# Altium footprint library SINA.PcbLib: 103 footprints (part 4 of 7)
Each footprint in its own frame and in the unit in brackets; x right, y up, seen from the top. Pads: shape width x height; smd on the part's side, far side on the other; paste and mask are expansions set on the pad; w line width, h text height; cw(c..) or ccw(c..) is an arc to the next point about the centre after c.
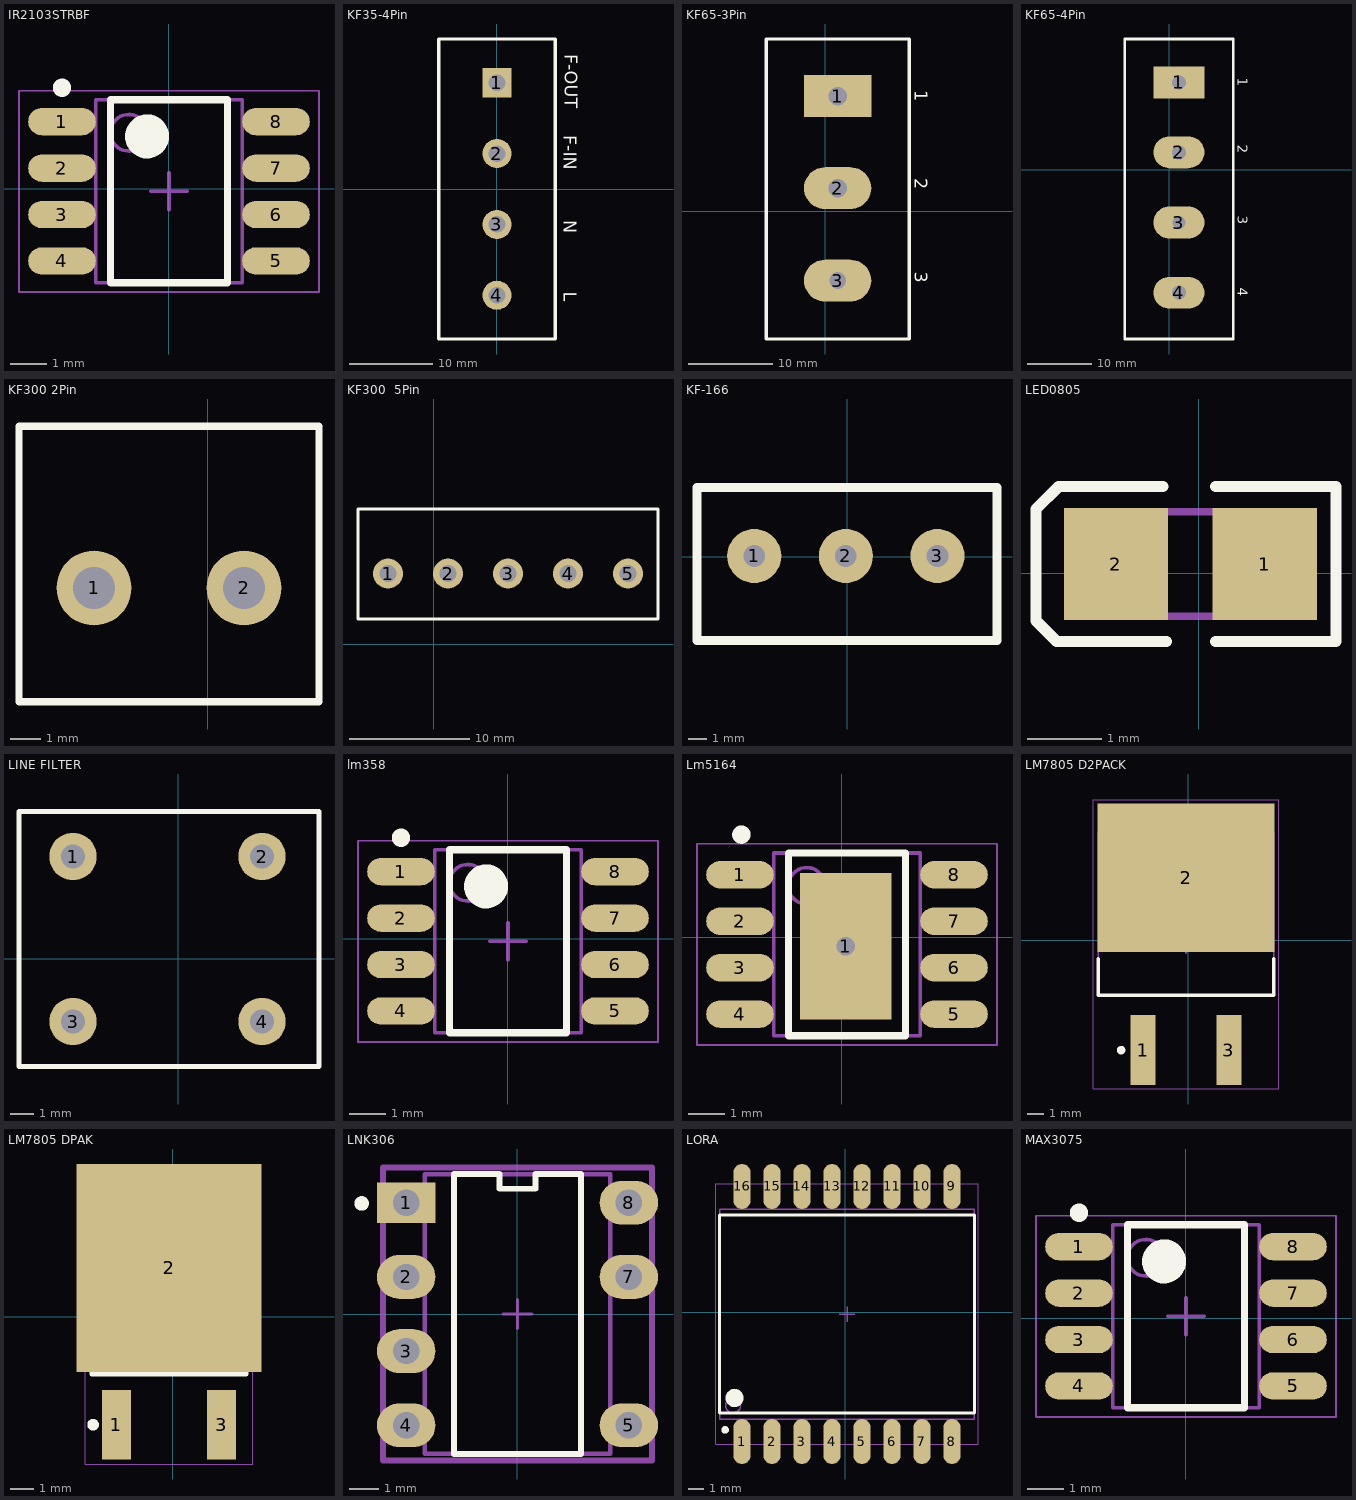
[diagram p3: the footprints below, top view; thin cyan lines are the x and y axes]

## IR2103STRBF [mm]
pads (8):
  oval 1.85x0.75 smd: 1(-2.915,1.831) 2(-2.915,0.561) 3(-2.915,-0.709) 4(-2.915,-1.979) 5(2.935,-1.979) 6(2.935,-0.709) 7(2.935,0.561) 8(2.935,1.831)
Top Overlay:
  circle w0.6: c-0.59,1.426 r0.3
  circle w0.25: c-2.915,2.756 r0.125
  lines w0.2: -1.59,-2.574 1.61,-2.574 1.61,2.426 -1.59,2.426 -1.59,-2.574
Mechanical 13:
  circle w0.1: c-1.09,1.526 r0.5
  lines w0.1: -1.99,-2.574 2.01,-2.574 2.01,2.426 -1.99,2.426 -1.99,-2.574
Mechanical 15:
  lines w0.05: -4.09,-2.824 4.11,-2.824 4.11,2.676 -4.09,2.676 -4.09,-2.824
  lines w0.1: -0.49,-0.074 0.51,-0.074 ; 0.01,-0.574 0.01,0.426
3D body "LM358.step": height 1.35, standoff 0, extent -3.24,-2.574 3.26,2.426

## KF35-4Pin [mm]
pads (4):
  rect 3.5x3.5 hole 2: 1(0,12.75)
  round 3.5 hole 2: 2(0,4.25) 3(0,-4.25) 4(0,-12.75)
Top Overlay:
  lines w0.406: -7,-18 -7,18 7,18 7,-18 -7,-18
  text "F-IN" at 8,6.475 h1.52
  text "F-OUT" at 8.125,16.175 h1.52
  text "N" at 8,-3.725 h1.52
  text "L" at 8,-12.35 h1.52
Mechanical 13:
  lines w0.1: -7,-18 -7,18 7,18 7,-18 -7,-18
3D body "LW3B  4P Terminal v1.step": height 14.65, standoff -3.8, extent -7.625,-17 7.625,17

## KF65-3Pin [mm]
pads (3):
  rect 8x5 hole 2.2: 1(1.5,13.7)
  oval 8x5 hole 2.2: 2(1.5,2.75)
  oval 8x5 hole 2: 3(1.5,-8.25)
Top Overlay:
  lines w0.406: -7,-15.2 10,-15.2 10,20.5 -7,20.5 -7,-15.2
  text "3" at 10.7,-7.2 h1.52
  text "1" at 10.7,14.4 h1.52
  text "2" at 10.7,3.9 h1.52
Mechanical 13:
  lines w0.1: -7,-15.2 10,-15.2 10,20.5 -7,20.5 -7,-15.2
3D body "anver_com-21700252-DEFAULT.STEP": height 15, standoff 6, extent -2.8,-13.1 5.2,-5.1
3D body "anver_com-21700252-DEFAULT.STEP": height 15, standoff 6, extent -2.9,-1.25 5.1,6.75
3D body "anver_com-21700252-DEFAULT.STEP": height 15, standoff 6, extent -2.6,10 5.4,18
3D body: height 5, standoff -4.5, extent 1.1,12.7 2,14.3
3D body: height 5, standoff -4.5, extent 1.1,1.9 2,3.5
3D body: height 5, standoff -4.5, extent 1.1,-9.1 2,-7.5
3D body: height 12, standoff 11, extent -3.7,-13.8 6.3,-3.8
3D body: height 12, standoff 11, extent -3.7,-2.3 6.3,7.7
3D body: height 12, standoff 11, extent -3.7,9.1 6.3,19.1
3D body: height 0.25, standoff 0, extent 20.3,10.6 20.3,10.6
3D body: height 10.5, standoff 1.8, extent -6.4,-15.1 9.4,19
3D body: height 0.25, standoff 0, extent -6.6,19 -6.6,19
3D body: height 1.8, standoff 0, extent -7,-15.125 10,20.5
3D body: height 18.7, standoff 0, extent -7,7.625 10,9.125
3D body: height 18.7, standoff 0, extent -7,-3.75 10,-2.25
3D body: height 18.7, standoff 0, extent -7,-15.125 10,-13.625
3D body: height 18.7, standoff 0, extent -7,19 10,20.5

## KF65-4Pin [mm]
pads (4):
  rect 8x5 hole 2.2: 1(1.5,13.7)
  oval 8x5 hole 2.2: 2(1.5,2.75) 4(1.5,-19.25)
  oval 8x5 hole 2: 3(1.5,-8.25)
Top Overlay:
  lines w0.406: -7,-26.5 -7,20.5 10,20.5 10,-26.5 -7,-26.5
  text "2" at 10.7,3.9 h1.52
  text "1" at 10.7,14.4 h1.52
  text "3" at 10.7,-7.2 h1.52
  text "4" at 10.7,-18.5 h1.52
Mechanical 13:
  lines w0.1: -7,-26.5 -7,20.5 10,20.5 10,-26.5 -7,-26.5
3D body: height 18.7, standoff 0, extent -7,19 10,20.5
3D body: height 18.7, standoff 0, extent -7,-26.5 10,-25
3D body: height 18.7, standoff 0, extent -7,-15.125 10,-13.625
3D body: height 18.7, standoff 0, extent -7,-3.75 10,-2.25
3D body: height 18.7, standoff 0, extent -7,7.625 10,9.125
3D body: height 1.8, standoff 0, extent -7,-26.5 10,20.5
3D body: height 0.25, standoff 0, extent -6.6,19 -6.6,19
3D body: height 10.5, standoff 1.8, extent -6.4,-25 9.4,19
3D body: height 0.25, standoff 0, extent 20.3,10.6 20.3,10.6
3D body: height 12, standoff 11, extent -3.7,9.1 6.3,19.1
3D body: height 12, standoff 11, extent -3.7,-2.3 6.3,7.7
3D body: height 12, standoff 11, extent -3.7,-13.8 6.3,-3.8
3D body: height 12, standoff 11, extent -3.7,-25.1 6.3,-15.1
3D body: height 5, standoff -4.5, extent 1.05,-20.1 1.95,-18.5
3D body: height 5, standoff -4.5, extent 1.1,-9.1 2,-7.5
3D body: height 5, standoff -4.5, extent 1.1,1.9 2,3.5
3D body: height 5, standoff -4.5, extent 1.1,12.7 2,14.3
3D body "anver_com-21700252-DEFAULT.STEP": height 15, standoff 6, extent -2.6,10 5.4,18
3D body "anver_com-21700252-DEFAULT.STEP": height 15, standoff 6, extent -2.9,-1.25 5.1,6.75
3D body "anver_com-21700252-DEFAULT.STEP": height 15, standoff 6, extent -2.8,-13.1 5.2,-5.1
3D body "anver_com-21700252-DEFAULT.STEP": height 15, standoff 6, extent -2.5,-24.3 5.5,-16.3

## KF300 2Pin [mm]
pads (2):
  round 2.5 hole 1.4: 1(-3.8,5.9) 2(1.2,5.9)
Top Overlay:
  lines w0.25: -6.3,2.1 3.7,2.1 3.7,11.3 -6.3,11.3 -6.3,2.1
3D body "User Library-bornera-1.STEP": height 10, standoff -3.75, extent -6.5,3.4 4,11
3D body: height 0.25, standoff 0, extent -1.1,1 -1.1,1

## KF300  5Pin [mm]
pads (5):
  round 2.5 hole 1.4: 1(-3.8,5.9) 2(1.2,5.9) 3(6.2,5.9) 4(11.2,5.9) 5(16.2,5.9)
Top Overlay:
  lines w0.25: 8.7,2.1 18.7,2.1 18.7,11.3 8.7,11.3 ; 13.7,2.1 3.7,2.1 -6.3,2.1 -6.3,11.3 3.7,11.3 13.7,11.3
3D body: height 0.25, standoff 0, extent -1.1,1 -1.1,1
3D body "User Library-bornera-1.STEP": height 10, standoff -3.75, extent -6.5,3.4 4,11
3D body "User Library-bornera-1.STEP": height 10, standoff -3.75, extent 3.5,3.4 14,11
3D body "User Library-bornera-1.STEP": height 10, standoff -3.75, extent 8.5,3.4 19,11

## KF-166 [mm]
pads (3):
  round 3 hole 1.2: 1(-5.165,0.049) 2(-0.085,0.049) 3(4.995,0.049)
Top Overlay:
  lines w0.5: -8.34,-4.65 -8.34,3.859 8.297,3.859 8.297,-4.65 -8.34,-4.65
3D body: height 12.6, standoff 9, extent -7.134,-2.364 6.963,2.462
3D body: height 9, standoff 0, extent -8.34,-4.65 8.297,3.732
3D body: height 0, standoff -4.3, extent 4.614,-0.459 5.376,0.303
3D body: height 0, standoff -4.3, extent -0.466,-0.459 0.296,0.303
3D body: height 0, standoff -4.3, extent -5.546,-0.332 -4.784,0.43
3D body: height 0.25, standoff 0, extent -6.181,-2.618 -6.181,-2.618

## LED0805 [mm]
pads (2):
  rect 1.4x1.5 smd: 1(0.889,0.127) 2(-1.111,0.127)
Top Overlay:
  lines w0.152: -0.483,1.168 -1.88,1.168 -2.184,0.864 -2.184,-0.635 -1.905,-0.914 -0.432,-0.914 ; 0.229,-0.914 1.845,-0.914 1.845,1.168 0.229,1.168
Mechanical 13:
  lines w0.1: -1.186,-0.573 0.964,-0.573 0.964,0.827 -1.186,0.827 -1.186,-0.573
3D body: height 0.65, standoff 0, extent -1.186,-0.573 0.964,0.827

## LINE FILTER [mm]
pads (4):
  round 2 hole 1: 1(-4.445,4.318) 2(3.556,4.318) 3(-4.445,-2.667) 4(3.556,-2.667)
Top Overlay:
  lines w0.2: -6.731,-4.572 -6.731,6.223 5.969,6.223 5.969,-4.572 -6.731,-4.572
3D body: height 14, standoff 0, extent -6.731,-4.572 5.969,6.223

## lm358 [mm]
pads (8):
  oval 1.85x0.75 smd: 1(-2.915,1.831) 2(-2.915,0.561) 3(-2.915,-0.709) 4(-2.915,-1.979) 5(2.935,-1.979) 6(2.935,-0.709) 7(2.935,0.561) 8(2.935,1.831)
Top Overlay:
  circle w0.25: c-2.915,2.756 r0.125
  circle w0.6: c-0.59,1.426 r0.3
  lines w0.2: -1.59,-2.574 -1.59,2.426 1.61,2.426 1.61,-2.574 -1.59,-2.574
Mechanical 13:
  circle w0.1: c-1.09,1.526 r0.5
  lines w0.1: -1.99,-2.574 -1.99,2.426 2.01,2.426 2.01,-2.574 -1.99,-2.574
Mechanical 15:
  lines w0.05: -4.09,-2.824 -4.09,2.676 4.11,2.676 4.11,-2.824 -4.09,-2.824
  lines w0.1: -0.49,-0.074 0.51,-0.074 ; 0.01,-0.574 0.01,0.426
3D body "LM358.step": height 1.35, standoff 0, extent -3.24,-2.574 3.26,2.426

## Lm5164 [mm]
pads (9):
  oval 1.85x0.75 smd: 1(-2.788,1.704) 2(-2.788,0.434) 3(-2.788,-0.836) 4(-2.788,-2.106) 5(3.062,-2.106) 6(3.062,-0.836) 7(3.062,0.434) 8(3.062,1.704)
  rect 2.5x4 hole 0.5: 1(0.1,-0.25)
Top Overlay:
  circle w0.25: c-2.75,2.8 r0.125
  lines w0.2: -1.463,-2.701 1.737,-2.701 1.737,2.299 -1.463,2.299 -1.463,-2.701
Mechanical 13:
  circle w0.1: c-0.963,1.399 r0.5
  lines w0.1: -1.863,-2.701 2.137,-2.701 2.137,2.299 -1.863,2.299 -1.863,-2.701
Mechanical 15:
  lines w0.05: -3.963,-2.951 4.237,-2.951 4.237,2.549 -3.963,2.549 -3.963,-2.951
  lines w0.1: -0.363,-0.201 0.637,-0.201 ; 0.137,-0.701 0.137,0.299
3D body "LM358.step": height 1.35, standoff 0, extent -3.113,-2.701 3.387,2.299

## LM7805 D2PACK [mm]
pads (3):
  rect 1.5x4.15 smd: 1(-2.667,-6.504) 3(2.413,-6.504)
  rect 10.5x8.8 smd: 2(-0.127,3.696)
Top Overlay:
  circle w0.25: c-3.967,-6.504 r0.125
  lines w0.2: -5.327,-1.104 -5.327,-3.254 5.073,-3.254 5.073,-1.104
Mechanical 13:
  lines w0.1: -5.327,-3.254 5.073,-3.254 5.073,6.396 -5.327,6.396 -5.327,-3.254
Mechanical 15:
  lines w0.05: -5.627,-8.804 5.373,-8.804 5.373,8.296 -5.627,8.296 -5.627,-8.804
  lines w0.1: -0.627,-0.254 0.373,-0.254 ; -0.127,-0.754 -0.127,0.246
3D body: height 4.83, standoff 0, extent -5.327,-3.254 5.073,6.396

## LM7805 DPAK [mm]
pads (3):
  rect 1.25x3 smd: 1(-2.453,-4.668) 3(2.107,-4.668)
  rect 8x9 smd: 2(-0.173,2.122)
Top Overlay:
  circle w0.25: c-3.463,-4.668 r0.125
  lines w0.2: -3.523,-2.088 -3.523,-2.488 3.177,-2.488 3.177,-2.088
Mechanical 13:
  lines w0.1: -3.548,-2.488 -3.548,3.732 3.202,3.732 3.202,-2.488 -3.548,-2.488
Mechanical 15:
  lines w0.05: -3.798,5.232 -3.798,-6.368 3.452,-6.368 3.452,5.232 ; -3.798,5.462 3.452,5.462
  lines w0.1: -0.673,-0.338 0.327,-0.338 ; -0.173,-0.838 -0.173,0.162
3D body "DPAK228P991X239-3N.step": height 2.84, standoff 0, extent -3.548,-4.708 3.202,5.197

## LNK306 [mm]
pads (7):
  rect 2x1.4 hole 0.9 paste-1000 mask+0: 1(-3.81,3.81)
  oval 2x1.5 hole 0.9 paste-1000 mask+0: 2(-3.81,1.27) 3(-3.81,-1.27) 4(-3.81,-3.81) 5(3.81,-3.81) 7(3.81,1.27) 8(3.81,3.81)
Top Overlay:
  circle w0.25: c-5.335,3.785 r0.125
  lines w0.2: -2.175,-4.788 2.175,-4.788 2.175,4.788 0.621,4.788 0.621,4.287 -0.621,4.287 -0.621,4.788 -2.175,4.788 -2.175,-4.788
Mechanical 10:
  lines w0.2: -4.61,-5.015 -4.61,5.015 4.61,5.015 4.61,-5.015 -4.61,-5.015
  text ".Designator" at 0,0 h1
Mechanical 12:
  lines w0.15: -3.175,-4.788 -3.175,4.788 3.175,4.788 3.175,-4.788 -3.175,-4.788
Mechanical 15:
  lines w0.1: -0.5,0 0.5,0 ; 0,-0.5 0,0.5
  lines w0.2: -4.61,-5.015 -4.61,5.015 4.61,5.015 4.61,-5.015 -4.61,-5.015
3D body "3dmodel.step": height 4.06, standoff -2, extent -4.082,-5.08 3.828,4.75

## LORA [mm]
pads (16):
  oval 1.15x3 smd: 1(-6.873,-8.627) 2(-4.873,-8.627) 3(-2.873,-8.627) 4(-0.873,-8.627) 5(1.127,-8.627) 6(3.127,-8.627) 7(5.127,-8.627) 8(7.127,-8.627) 9(7.127,8.373) 10(5.127,8.373) 11(3.127,8.373) 12(1.127,8.373) 13(-0.873,8.373) 14(-2.873,8.373) 15(-4.873,8.373) 16(-6.873,8.373)
Top Overlay:
  circle w0.25: c-7.998,-7.852 r0.125
  circle w0.6: c-7.373,-5.727 r0.3
  lines w0.2: -8.373,-6.727 8.627,-6.727 8.627,6.473 -8.373,6.473 -8.373,-6.727
Mechanical 13:
  circle w0.1: c-7.473,-6.227 r0.5
  lines w0.1: -8.373,-7.127 8.627,-7.127 8.627,6.873 -8.373,6.873 -8.373,-7.127
Mechanical 15:
  lines w0.05: -8.623,-8.802 8.877,-8.802 8.877,8.548 -8.623,8.548 -8.623,-8.802
  lines w0.1: -0.373,-0.127 0.627,-0.127 ; 0.127,-0.627 0.127,0.373
3D body: height 3, standoff 0.05, extent -8.373,-7.127 8.627,6.873

## MAX3075 [mm]
pads (8):
  oval 1.85x0.75 smd: 1(-2.915,1.958) 2(-2.915,0.688) 3(-2.915,-0.582) 4(-2.915,-1.852) 5(2.935,-1.852) 6(2.935,-0.582) 7(2.935,0.688) 8(2.935,1.958)
Top Overlay:
  circle w0.6: c-0.59,1.553 r0.3
  circle w0.25: c-2.915,2.883 r0.125
  lines w0.2: -1.59,-2.447 1.61,-2.447 1.61,2.553 -1.59,2.553 -1.59,-2.447
Mechanical 13:
  circle w0.1: c-1.09,1.653 r0.5
  lines w0.1: -1.99,-2.447 2.01,-2.447 2.01,2.553 -1.99,2.553 -1.99,-2.447
Mechanical 15:
  lines w0.05: -4.09,-2.697 4.11,-2.697 4.11,2.803 -4.09,2.803 -4.09,-2.697
  lines w0.1: -0.49,0.053 0.51,0.053 ; 0.01,-0.447 0.01,0.553
3D body "LM358.step": height 1.35, standoff 0, extent -3.24,-2.447 3.26,2.553